# Altium schematic symbol library Electronic Devices_LIB.SchLib: 703 symbols (part 1 of 8) (continued)
## CAP_27pF_50V_NP0_0402
designator C?, comment Voltage Rating (DC): 50V  Capacitance: 27pF  Case/Package: 0402  (hidden comment: GRM1555C1H270JA01D)
Multilayer Ceramic Capacitor, 27 pF, 50 V, ± 5%, C0G (NP0), 0402 [1005 Metric]; Manufacturer: Murata; Temperature Coefficient: 30ppm/°C; Supplier 1: Mouser; Manufacturer Part Number: GRM1555C1H270JA01D; RoHS: Yes; Category: Ceramic Capacitors; Stock 1: 198325; Pricing 1: 1=0.1, 10=0.013, 50=0.013, 100=0.008, 1000=0.007, 10000=0.004 (USD); Mount: Surface Mount; Number of Pins: 2; Case Code (Metric): 1005; Case Code (Imperial): 0402; Material: Ceramic; Min Operating Temperature: -55°C; Max Operating Temperature: 125°C; Voltage Rating: 50V; Package Quantity: 1; Series: GRM; Tolerance: 5%; Packaging: Tape and Reel; Dielectric: C0G; Termination: SMD/SMT; Voltage: 50V; Construction: Flat; Length: 1mm; Width: 0.02inch; Height: 0.5mm; Thickness: 0.022inch; Depth: 0.5mm; Radiation Hardening: No; Reach SVHC Compliant: No; RoHS Compliant: Yes; Lead Free: Lead Free; ComponentLink1URL: https://datasheet.ciiva.com/6048/1784399-6048453.pdf?src-supplier=Farnell; ComponentLink1Description: https://datasheet.ciiva.com/6048/1784399-6048453.pdf?src-supplier=Farnell; ComponentLink2URL: https://datasheet.ciiva.com/2989/product-2989312.pdf?src-supplier=Avnet; ComponentLink2Description: https://datasheet.ciiva.com/2989/product-2989312.pdf?src-supplier=Avnet; ComponentLink3URL: https://datasheet.ciiva.com/18184/getdatasheetpartid-296877-18184278.pdf?src-supplier=Verical; ComponentLink3Description: https://datasheet.ciiva.com/18184/getdatasheetpartid-296877-18184278.pdf?src-supplier=Verical; ComponentLink4URL: https://datasheet.ciiva.com/6277/partnumbering-e-01-6277817.pdf?src-supplier=Digikey; ComponentLink4Description: https://datasheet.ciiva.com/6277/partnumbering-e-01-6277817.pdf?src-supplier=Digikey; ComponentLink5URL: https://datasheet.ciiva.com/6277/partnumbering-e-01-6277818.pdf?src-supplier=Digikey; ComponentLink5Description: https://datasheet.ciiva.com/6277/partnumbering-e-01-6277818.pdf?src-supplier=Digikey; ComponentLink6URL: https://datasheet.ciiva.com/6277/partnumbering-e-01-6277819.pdf?src-supplier=Digikey; ComponentLink6Description: https://datasheet.ciiva.com/6277/partnumbering-e-01-6277819.pdf?src-supplier=Digikey; ComponentLink7URL: https://datasheet.ciiva.com/7828/1784399-7828854.pdf?src-supplier=Element14; ComponentLink7Description: https://datasheet.ciiva.com/7828/1784399-7828854.pdf?src-supplier=Element14; ComponentLink8URL: https://datasheet.ciiva.com/16440/product-16440556.pdf?src-supplier=Future+Electronics; ComponentLink8Description: https://datasheet.ciiva.com/16440/product-16440556.pdf?src-supplier=Future+Electronics; Supplier Part Number 1: 81-GRM1555C1H270JA1D
footprint CAP_0402_CAPC1005X05N (Chip Capacitor, 2-Leads, Body 1.00x0.50mm, IPC Medium Density)
pins: 1, 2

## CAP_33uF_16V_X5R_1206
designator C?, comment Voltage Rating (DC): 16V  Capacitance: 33uF  Case/Package: 1206  (hidden comment: C3216X5R1C336M160AB)
C Series 1206 33 uF 16 V ±20 % Tolerance X5R SMT Multilayer Ceramic Capacitor; Manufacturer: TDK; Material: 4241ConductorMaterial; Tolerance: 20%; Supplier 1: Digikey; Manufacturer Part Number: C3216X5R1C336M160AB; RoHS: Yes; Category: Ceramic Capacitors; Stock 1: 76014; Pricing 1: 1=0.97, 10=0.7, 50=0.6118, 100=0.4985, 500=0.40788, 1000=0.35123 (USD); Mount: Surface Mount; Dielectric Material: Ceramic; Case Code (Metric): 3216; Case Code (Imperial): 1206; Weight: 0.000571oz; Min Operating Temperature: -55°C; Max Operating Temperature: 85°C; Packaging: Tape and Reel; Dielectric: X5R; Package Quantity: 2000; Voltage Rating: 16V; Termination: SMD/SMT; Series: C; Construction: Flat; Length: 3.2mm; Width: 1.6mm; Height: 1.6mm; Depth: 1.6mm; Radiation Hardening: No; Reach SVHC Compliant: No; Lead Free: Lead Free; RoHS Compliant: Yes; ComponentLink1URL: https://datasheet.ciiva.com/24219/c3216x5r1c336m160ab-265284-24219738.pdf?src-supplier=Mouser; ComponentLink1Description: https://datasheet.ciiva.com/24219/c3216x5r1c336m160ab-265284-24219738.pdf?src-supplier=Mouser; ComponentLink2URL: https://datasheet.ciiva.com/15192/getdatasheetpartid-714446-15192221.pdf?src-supplier=Verical; ComponentLink2Description: https://datasheet.ciiva.com/15192/getdatasheetpartid-714446-15192221.pdf?src-supplier=Verical; ComponentLink3URL: https://datasheet.ciiva.com/6285/tdkmlcccaprange-6285581.pdf?src-supplier=Digikey; ComponentLink3Description: https://datasheet.ciiva.com/6285/tdkmlcccaprange-6285581.pdf?src-supplier=Digikey; ComponentLink4URL: https://datasheet.ciiva.com/6285/tdkmlcccaprange-6285583.pdf?src-supplier=Digikey; ComponentLink4Description: https://datasheet.ciiva.com/6285/tdkmlcccaprange-6285583.pdf?src-supplier=Digikey; ComponentLink5URL: https://datasheet.ciiva.com/6285/tdkmlcccaprange-6285578.pdf?src-supplier=Digikey; ComponentLink5Description: https://datasheet.ciiva.com/6285/tdkmlcccaprange-6285578.pdf?src-supplier=Digikey; Supplier Part Number 1: 445-6002-1-ND
footprint CAP_1206_CAPC3216X16N (Chip Capacitor, 2-Leads, Body 3.20x1.60mm, IPC Medium Density)
pins: 1, 2

## CAP_33uF_16V_X5R_1812
designator C?, comment Voltage Rating (DC): 16V  Case Code (Imperial): 1812  Capacitance: 33uF  (hidden comment: C4532X5R1C336M250KA)
33 µF ±20% 16V Ceramic Capacitor X5R 1812 (4532 Metric); Manufacturer: TDK; Supplier 1: Digikey; Manufacturer Part Number: C4532X5R1C336M250KA; RoHS: Yes; Category: Ceramic Capacitors; Stock 1: 1235; Pricing 1: 1=1.06, 10=0.763, 50=0.6674, 100=0.5438 (USD); Mount: Surface Mount; Case/Package: 1812; Number of Pins: 2NUMBER; Case Code (Metric): 4532; Weight: 0.000952oz; Min Operating Temperature: -55°C; Max Operating Temperature: 85°C; Tolerance: 20%; Packaging: Cut Tape; Dielectric: X5R; Construction: Flat; Voltage Rating: 16V; Package Quantity: 500; Termination: SMD/SMT; Voltage: 16V; Series: C; Length: 4.5mm; Width: 3.2mm; Height: 2.5mm; Depth: 3.2mm; RoHS Compliant: Yes; Reach SVHC Compliant: No; ComponentLink1URL: https://datasheet.ciiva.com/24219/c4532x5r1c336m250ka-265571-24219720.pdf?src-supplier=Mouser; ComponentLink1Description: https://datasheet.ciiva.com/24219/c4532x5r1c336m250ka-265571-24219720.pdf?src-supplier=Mouser; ComponentLink2URL: https://datasheet.ciiva.com/11788/0900766b80c1bb00-11788291.pdf?src-supplier=Rs; ComponentLink2Description: https://datasheet.ciiva.com/11788/0900766b80c1bb00-11788291.pdf?src-supplier=Rs; ComponentLink3URL: https://datasheet.ciiva.com/16476/e412-c-16476108.pdf?src-supplier=Future+Electronics; ComponentLink3Description: https://datasheet.ciiva.com/16476/e412-c-16476108.pdf?src-supplier=Future+Electronics; ComponentLink4URL: https://datasheet.ciiva.com/6253/tdkmlcccaprange-6253381.pdf?src-supplier=Digikey; ComponentLink4Description: https://datasheet.ciiva.com/6253/tdkmlcccaprange-6253381.pdf?src-supplier=Digikey; ComponentLink5URL: https://datasheet.ciiva.com/6253/tdkmlcccaprange-6253383.pdf?src-supplier=Digikey; ComponentLink5Description: https://datasheet.ciiva.com/6253/tdkmlcccaprange-6253383.pdf?src-supplier=Digikey; Supplier Part Number 1: 445-1443-1-ND
footprint CAP_1218
pins: 1, 2

## CAP_47UF_10V_X5R_0805
designator C?, comment Voltage Rating (DC): 10V  Capacitance: 47uF  Case Code (Imperial): 0805  (hidden comment: C2012X5R1A476M125AC)
Multilayer Ceramic Capacitor, 47 uF, 10 V, ± 20%, X5R, 0805 [2012 Metric]; Manufacturer: TDK; Material: 4241ConductorMaterial; Supplier 1: Digikey; Manufacturer Part Number: C2012X5R1A476M125AC; RoHS: Yes; Category: Ceramic Capacitors; Stock 1: 476295; Pricing 1: 1=0.79, 10=0.572, 50=0.5006, 100=0.4079, 500=0.33372, 1000=0.28737 (USD); Mount: Surface Mount; Case/Package: 0805; Dielectric Material: Ceramic; Case Code (Metric): 2012; Weight: 0.000194oz; Min Operating Temperature: -55°C; Max Operating Temperature: 85°C; Tolerance: 20%; Packaging: Tape and Reel; Dielectric: X5R; Package Quantity: 1; Voltage Rating: 10V; Termination: SMD/SMT; Voltage: 10V; Series: C; Length: 2mm; Width: 0.049inch; Height: 1.25mm; Depth: 1.25mm; Thickness: 0.057inch; Lead Free: Lead Free; Reach SVHC Compliant: No; RoHS Compliant: Yes; ComponentLink1URL: https://datasheet.ciiva.com/24216/c2012x5r1a476m125ac-264921-24216523.pdf?src-supplier=Mouser; ComponentLink1Description: https://datasheet.ciiva.com/24216/c2012x5r1a476m125ac-264921-24216523.pdf?src-supplier=Mouser; ComponentLink2URL: https://datasheet.ciiva.com/24191/c2012x5r1a476m125ac-24191773.pdf?src-supplier=Future+Electronics; ComponentLink2Description: https://datasheet.ciiva.com/24191/c2012x5r1a476m125ac-24191773.pdf?src-supplier=Future+Electronics; ComponentLink3URL: https://datasheet.ciiva.com/7975/1796654-7975085.pdf?src-supplier=Element14; ComponentLink3Description: https://datasheet.ciiva.com/7975/1796654-7975085.pdf?src-supplier=Element14; ComponentLink4URL: https://datasheet.ciiva.com/22694/1796654-22694142.pdf?src-supplier=Element14; ComponentLink4Description: https://datasheet.ciiva.com/22694/1796654-22694142.pdf?src-supplier=Element14; ComponentLink5URL: https://datasheet.ciiva.com/6259/tdkmlcccaprange-6259576.pdf?src-supplier=Digikey; ComponentLink5Description: https://datasheet.ciiva.com/6259/tdkmlcccaprange-6259576.pdf?src-supplier=Digikey; ComponentLink6URL: https://datasheet.ciiva.com/6259/tdkmlcccaprange-6259575.pdf?src-supplier=Digikey; ComponentLink6Description: https://datasheet.ciiva.com/6259/tdkmlcccaprange-6259575.pdf?src-supplier=Digikey; ComponentLink7URL: https://datasheet.ciiva.com/6259/tdkmlcccaprange-6259577.pdf?src-supplier=Digikey; ComponentLink7Description: https://datasheet.ciiva.com/6259/tdkmlcccaprange-6259577.pdf?src-supplier=Digikey; Supplier Part Number 1: 445-8239-6-ND
footprint CAP_0805_CAPC2012X12N (Chip Capacitor, 2-Leads, Body 2.00x1.25mm, IPC Medium Density)
pins: 1, 2

## CAP_47UF_16V_X5R_1206
designator C?, comment Capacitance: 47uF  Voltage Rating: 16V  Case/Package: 1206  (hidden comment: EMK316BBJ476ML-T)
Multilayer Ceramic Capacitor, 47 uF, 16 V, ± 20%, X5R, 1206 [3216 Metric]; Manufacturer: Taiyo Yuden; Supplier 1: Digi-Key; Manufacturer Part Number: EMK316BBJ476ML-T; RoHS: Yes; Category: Ceramic Capacitors; Stock 1: 339005; Pricing 1: 1=0.64, 10=0.451, 50=0.38, 100=0.3095, 500=0.25792, 1000=0.21719 (USD); Mount: Surface Mount; Case Code (Imperial): 1206; Case Code (Metric): 3216; Min Operating Temperature: -55°C; Max Operating Temperature: 85°C; Packaging: Cut Tape; Tolerance: 20%; Series: M; RoHS Compliant: Yes; ComponentLink1URL: http://www.farnell.com/datasheets/2819853.pdf?src-supplier=Farnell; ComponentLink1Description: http://www.farnell.com/datasheets/2819853.pdf?src-supplier=Farnell; ComponentLink2URL: http://www.farnell.com/datasheets/2819853.pdf?src-supplier=Newark; ComponentLink2Description: http://www.farnell.com/datasheets/2819853.pdf?src-supplier=Newark; ComponentLink3URL: https://datasheet.octopart.com/EMK316BBJ476ML-T-Taiyo-Yuden-datasheet-103922570.pdf?src-supplier=Future+Electronics; ComponentLink3Description: https://datasheet.octopart.com/EMK316BBJ476ML-T-Taiyo-Yuden-datasheet-103922570.pdf?src-supplier=Future+Electronics; ComponentLink4URL: http://www.farnell.com/datasheets/2819853.pdf?src-supplier=Element14; ComponentLink4Description: http://www.farnell.com/datasheets/2819853.pdf?src-supplier=Element14; ComponentLink5URL: http://ds.yuden.co.jp/TYCOMPAS/ut/detail.do?productNo=EMK316BBJ476ML-T&fileName=EMK316BBJ476ML-T_SS&mode=specSheetDownload&src-supplier=Digi-Key; ComponentLink5Description: http://ds.yuden.co.jp/TYCOMPAS/ut/detail.do?productNo=EMK316BBJ476ML-T&fileName=EMK316BBJ476ML-T_SS&mode=specSheetDownload&src-supplier=Digi-Key; ComponentLink6URL: https://datasheet.octopart.com/EMK316BBJ476ML-T-Taiyo-Yuden-datasheet-140424376.pdf?src-supplier=Master+Electronics; ComponentLink6Description: https://datasheet.octopart.com/EMK316BBJ476ML-T-Taiyo-Yuden-datasheet-140424376.pdf?src-supplier=Master+Electronics; Supplier Part Number 1: 587-5425-1-ND
footprint CAP_1206_CAPC3216X16N (Chip Capacitor, 2-Leads, Body 3.20x1.60mm, IPC Medium Density)
pins: 1, 2

## CAP_47uF_35V_ELEC
designator C?, comment 865080543009  Capacitance: 47uF  Voltage Rating: 35V
Alum. Electrolytic Cap 47µF 35V 6.3mmV-Chip WCAP-ASLI; Lifetime 2000h +105°C | Wurth Electronics 865080543009; Ripple Current: 240mA; Impedance: 530mR; Tolerance: 20%; Supplier 1: Digi-Key; Manufacturer: Wurth Electronics; Manufacturer Part Number: 865080543009; RoHS: Yes; Category: Aluminum Electrolytic Capacitors; Stock 1: 88642; Pricing 1: 1=0.28, 50=0.237, 100=0.207, 250=0.183, 500=0.161 (USD); Mount: Surface Mount; Case/Package: Radial; Min Operating Temperature: -55°C; Max Operating Temperature: 105°C; Package Quantity: 1; Packaging: Cut Tape; Ripple Current (AC): 240mA; Voltage Rating (DC): 35V; Series: WCAP-ASLI; Diameter: 6.3mm; Height: 5.5mm; Height - Seated (Max): 0.217inch; RoHS Compliant: Yes; Reach SVHC Compliant: Unknown; ComponentLink1URL: http://www.farnell.com/datasheets/1880161.pdf?src-supplier=Farnell; ComponentLink1Description: http://www.farnell.com/datasheets/1880161.pdf?src-supplier=Farnell; ComponentLink2URL: http://www.farnell.com/datasheets/1880161.pdf?src-supplier=Element14; ComponentLink2Description: http://www.farnell.com/datasheets/1880161.pdf?src-supplier=Element14; ComponentLink3URL: http://www.farnell.com/datasheets/1880161.pdf?src-supplier=Newark; ComponentLink3Description: http://www.farnell.com/datasheets/1880161.pdf?src-supplier=Newark; ComponentLink4URL: https://katalog.we-online.de/pbs/datasheet/865080543009.pdf?src-supplier=Digi-Key; ComponentLink4Description: https://katalog.we-online.de/pbs/datasheet/865080543009.pdf?src-supplier=Digi-Key; Supplier Part Number 1: 732-8508-1-ND
footprint CAPAE660X550N (0.260" L x 0.260" W (6.60mm x 6.60mm))
pins: 1 +, 2 -

## CAP_100NF_4V_X5R_0201
designator C?, comment Voltage Rating: 4V  Capacitance: 100nF  Case/Package: 0201  (hidden comment: C0201C104K7PAC7867)
SMD Comm X5R 0201 (0603Metric) ceramic capacitor 0.024Lx0.012W 0.60mmx0.30mm X5R ±10% 0.1muF; Manufacturer: KEMET; Supplier 1: Digikey; Manufacturer Part Number: C0201C104K7PAC7867; RoHS: No; Category: Ceramic Capacitors; Stock 1: 29615; Pricing 1: 1=0.16, 10=0.111, 50=0.0662, 100=0.0521, 500=0.0385, 1000=0.03188, 2500=0.02967, 5000=0.02714 (USD); Mount: Surface Mount; Case Code (Imperial): 0201; Case Code (Metric): 0603; Min Operating Temperature: -55°C; Max Operating Temperature: 85°C; Packaging: Cut Tape; Tolerance: 10%; Series: C; ComponentLink1URL: https://api.kemet.com/component-edge/download/datasheet/C0201C104K7PAC7867.pdf?src-supplier=Digikey; ComponentLink1Description: https://api.kemet.com/component-edge/download/datasheet/C0201C104K7PAC7867.pdf?src-supplier=Digikey; Supplier Part Number 1: 399-14860-6-ND
footprint CAP_0201_CAPC0603X03N (Chip Capacitor, 2-Leads, Body 0.60x0.30mm, IPC Medium Density)
pins: 1, 2

## CAP_100nF_10V_X5R_0402
designator C?, comment Case Code (Imperial): 0402  Voltage Rating (DC): 10V  Capacitance: 100nF  (hidden comment: GRM155R61A104KA01D)
Multilayer Ceramic Capacitor, 0.1 uF, 10 V, ± 10%, X5R, 0402 [1005 Metric]; Manufacturer: Murata; Supplier 1: Digikey; Manufacturer Part Number: GRM155R61A104KA01D; RoHS: Yes; Category: Ceramic Capacitors; Stock 1: 2175825; Pricing 1: 1=0.1, 10=0.033, 50=0.0192, 100=0.0148, 500=0.01118, 1000=0.00878, 2500=0.00798, 5000=0.00734 (USD); Mount: Surface Mount; Case/Package: 0402; Number of Pins: 2; Case Code (Metric): 1005; Min Operating Temperature: -55°C; Max Operating Temperature: 85°C; Tolerance: 10%; Packaging: Tape and Reel; Voltage Rating: 10V; Package Quantity: 1; Dielectric: X5R; Termination: SMD/SMT; Voltage: 10V; Series: GRM; Length: 1mm; Width: 0.02inch; Height: 0.5mm; Thickness: 0.022inch; Depth: 0.5mm; Radiation Hardening: No; Reach SVHC Compliant: No; Lead Free: Lead Free; RoHS Compliant: Yes; ComponentLink1URL: https://datasheet.ciiva.com/162/product-162752.pdf?src-supplier=Digikey; ComponentLink1Description: https://datasheet.ciiva.com/162/product-162752.pdf?src-supplier=Digikey; ComponentLink2URL: https://datasheet.ciiva.com/18102/getdatasheetpartid-74533-18102605.pdf?src-supplier=Verical; ComponentLink2Description: https://datasheet.ciiva.com/18102/getdatasheetpartid-74533-18102605.pdf?src-supplier=Verical; ComponentLink3URL: https://datasheet.ciiva.com/162/partnumbering-e-01-162751.pdf?src-supplier=Digikey; ComponentLink3Description: https://datasheet.ciiva.com/162/partnumbering-e-01-162751.pdf?src-supplier=Digikey; ComponentLink4URL: https://datasheet.ciiva.com/162/partnumbering-e-01-162753.pdf?src-supplier=Digikey; ComponentLink4Description: https://datasheet.ciiva.com/162/partnumbering-e-01-162753.pdf?src-supplier=Digikey; ComponentLink5URL: https://datasheet.ciiva.com/22698/608985-22698411.pdf?src-supplier=Element14; ComponentLink5Description: https://datasheet.ciiva.com/22698/608985-22698411.pdf?src-supplier=Element14; ComponentLink6URL: https://datasheet.ciiva.com/28584/608985-28584203.pdf?src-supplier=Element14; ComponentLink6Description: https://datasheet.ciiva.com/28584/608985-28584203.pdf?src-supplier=Element14; ComponentLink7URL: https://datasheet.ciiva.com/28685/608985-28685384.pdf?src-supplier=Element14; ComponentLink7Description: https://datasheet.ciiva.com/28685/608985-28685384.pdf?src-supplier=Element14; ComponentLink8URL: https://datasheet.ciiva.com/16199/product-16199050.pdf?src-supplier=Future+Electronics; ComponentLink8Description: https://datasheet.ciiva.com/16199/product-16199050.pdf?src-supplier=Future+Electronics; ComponentLink9URL: https://datasheet.ciiva.com/7718/608985-7718999.pdf?src-supplier=Element14; ComponentLink9Description: https://datasheet.ciiva.com/7718/608985-7718999.pdf?src-supplier=Element14; Supplier Part Number 1: 490-1318-1-ND
footprint CAP_0402_CAPC1005X05N (Chip Capacitor, 2-Leads, Body 1.00x0.50mm, IPC Medium Density)
pins: 1, 2

## CAP_100NF_16V_X7R_0402
designator C?, comment Voltage Rating: 16V  Capacitance: 100nF  Case/Package: 0402  (hidden comment: CL05B104KO5NNNC)
Multilayer Ceramic Capacitor, 0.1 uF, 16 V, ± 10%, X7R, 0402 [1005 Metric]; Manufacturer: Samsung; Supplier 1: Digi-Key; Manufacturer Part Number: CL05B104KO5NNNC; RoHS: Yes; Category: Ceramic Capacitors; Stock 1: 11081064; Pricing 1: 1=0.1, 10=0.024, 50=0.013, 100=0.0105, 500=0.00752, 1000=0.00592, 2500=0.00538, 5000=0.00495 (USD); Mount: Surface Mount; Case Code (Metric): 1005; Case Code (Imperial): 0402; Material: Ceramic; Min Operating Temperature: -55°C; Max Operating Temperature: 125°C; Tolerance: 10%; Package Quantity: 1; Packaging: Tape and Reel; Dielectric: X7R; Series: CL; Voltage: 16V; Voltage Rating (DC): 16V; Construction: Flat; Length: 1mm; Width: 0.02inch; Height: 0.5mm; Thickness: 0.022inch; Depth: 0.5mm; Radiation Hardening: No; RoHS Compliant: Yes; Lead Free: Lead Free; ComponentLink1URL: https://datasheet.ciiva.com/26920/getdatasheetpartid-359683-26920169.pdf?src-supplier=Verical; ComponentLink1Description: https://datasheet.ciiva.com/26920/getdatasheetpartid-359683-26920169.pdf?src-supplier=Verical; ComponentLink2URL: https://datasheet.ciiva.com/29198/458718-da-01-en-vs-kondensator-0402-29198423.pdf?src-supplier=Conrad; ComponentLink2Description: https://datasheet.ciiva.com/29198/458718-da-01-en-vs-kondensator-0402-29198423.pdf?src-supplier=Conrad; ComponentLink3URL: https://datasheet.ciiva.com/16208/cl05b104kq5nnnc-16208343.pdf?src-supplier=Future+Electronics; ComponentLink3Description: https://datasheet.ciiva.com/16208/cl05b104kq5nnnc-16208343.pdf?src-supplier=Future+Electronics; ComponentLink4URL: https://datasheet.ciiva.com/26309/mlcc-catalogdownload2013-eng-26309003.pdf?src-supplier=Distrelec; ComponentLink4Description: https://datasheet.ciiva.com/26309/mlcc-catalogdownload2013-eng-26309003.pdf?src-supplier=Distrelec; Supplier Part Number 1: 1276-1001-6-ND
footprint CAP_0402_CAPC1005X05N (Chip Capacitor, 2-Leads, Body 1.00x0.50mm, IPC Medium Density)
pins: 1, 2

## CAP_100NF_16V_X7R_0603
designator C?, comment Voltage: 16V  Capacitance: 100nF  Case/Package: 0603  (hidden comment: CL10B104KO8NNNC)
Ceramic capacitor SMD-0603 100nF /16V X7R# K +-10%, Samsung, RoHS; Dielectric: X7R; Tolerance: 10%; Manufacturer: Samsung; Manufacturer Part Number: CL10B104KO8NNNC; RoHS: Yes; Category: Ceramic Capacitors; Stock 1: 9799745; Pricing 1: 1=0.10000, 10=0.02700, 50=0.01500, 100=0.01220, 500=0.00874, 1000=0.00686 (USD); Mount: Surface Mount; Case Code (Metric): 1608; Case Code (Imperial): 0603; Material: Ceramic; Contact Plating: Tin; Min Operating Temperature: -55°C; Max Operating Temperature: 125°C; Packaging: Tape and Reel; Package Quantity: 1; Voltage Rating: 16V; Series: CL; Length: 1.6mm; Width: 0.031inch; Height: 0.8mm; Depth: 0.8mm; Thickness: 0.035inch; Radiation Hardening: No; Lead Free: Lead Free; RoHS Compliant: Yes; ComponentLink1URL: https://datasheet.ciiva.com/25805/cl10b104ko8nnnc-25805483.pdf?src-supplier=Digi-Key; ComponentLink1Description: https://datasheet.ciiva.com/25805/cl10b104ko8nnnc-25805483.pdf?src-supplier=Digi-Key; ComponentLink2URL: https://datasheet.ciiva.com/26838/getdatasheetpartid-357417-26838418.pdf?src-supplier=Verical; ComponentLink2Description: https://datasheet.ciiva.com/26838/getdatasheetpartid-357417-26838418.pdf?src-supplier=Verical; ComponentLink3URL: https://datasheet.ciiva.com/29198/456679-da-01-en-vs-kondensator-0603-29198846.pdf?src-supplier=Conrad; ComponentLink3Description: https://datasheet.ciiva.com/29198/456679-da-01-en-vs-kondensator-0603-29198846.pdf?src-supplier=Conrad; Supplier 1: Digi-Key; Supplier 2: Newark; Supplier 3: Mouser; Supplier Part Number 1: 1276-1005-1-ND; Supplier Part Number 2: 82AC9325; Supplier Part Number 3: 187-CL10B104KO8NNNC
footprint CAP_0603_CAPC1608X08N (Chip Capacitor, 2-Leads, Body 1.60x0.80mm, IPC Medium Density)
pins: 1, 2

## CAP_100nF_16V_X7S_0201
designator C?, comment Voltage Rating: 16V  Capacitance: 100nF  Case/Package: 0201  (hidden comment: GRM033C71C104KE14D)
Multilayer Ceramic Capacitor, 0.1 uF, 16 V, ± 10%, X7S, 0201 [0603 Metric]; Manufacturer: Murata; Material: 4241ConductorMaterial; Supplier 1: Digikey; Manufacturer Part Number: GRM033C71C104KE14D; RoHS: Yes; Category: Ceramic Capacitors; Stock 1: 1786846; Pricing 1: 1=0.1, 10=0.032, 50=0.0186, 100=0.0144, 500=0.01082, 1000=0.0085, 2500=0.00772, 5000=0.00711 (USD); Mount: Surface Mount; Case Code (Metric): 0603; Case Code (Imperial): 0201; Weight: 1.2E-05oz; Min Operating Temperature: -55°C; Max Operating Temperature: 125°C; Packaging: Tape and Reel; Tolerance: 10%; Dielectric: X7S; Termination: SMD/SMT; Voltage Rating (DC): 16V; Package Quantity: 15000; Series: GRM; Length: 0.024inch; Width: 0.012inch; Height: 0.3mm; Thickness: 0.013inch; RoHS Compliant: Yes; ComponentLink1URL: http://www.farnell.com/datasheets/2867828.pdf?src-supplier=Farnell; ComponentLink1Description: http://www.farnell.com/datasheets/2867828.pdf?src-supplier=Farnell; ComponentLink2URL: http://www.mouser.com/ds/2/281/c02e-2905.pdf?src-supplier=Mouser; ComponentLink2Description: http://www.mouser.com/ds/2/281/c02e-2905.pdf?src-supplier=Mouser; ComponentLink3URL: https://search.murata.co.jp/Ceramy/image/img/A01X/G101/ENG/GRM033C71C104KE14-01.pdf?src-supplier=Digikey; ComponentLink3Description: https://search.murata.co.jp/Ceramy/image/img/A01X/G101/ENG/GRM033C71C104KE14-01.pdf?src-supplier=Digikey; ComponentLink4URL: http://www.farnell.com/datasheets/2867828.pdf?src-supplier=Element14; ComponentLink4Description: http://www.farnell.com/datasheets/2867828.pdf?src-supplier=Element14; ComponentLink5URL: https://datasheet.octopart.com/GRM033C71C104KE14D-Murata-datasheet-22122223.pdf?src-supplier=Future+Electronics; ComponentLink5Description: https://datasheet.octopart.com/GRM033C71C104KE14D-Murata-datasheet-22122223.pdf?src-supplier=Future+Electronics; ComponentLink6URL: http://www.farnell.com/datasheets/2867828.pdf?src-supplier=Newark; ComponentLink6Description: http://www.farnell.com/datasheets/2867828.pdf?src-supplier=Newark; Supplier Part Number 1: 490-10387-6-ND
footprint CAP_0201_CAPC0603X03N (Chip Capacitor, 2-Leads, Body 0.60x0.30mm, IPC Medium Density)
pins: 1, 2

## CAP_100NF_25V_X7R_0402
designator C?, comment Capacitance: 100nF  Voltage Rating: 25V  Case/Package: 0402  (hidden comment: CC0402KRX5R8BB104)
Multilayer Ceramic Capacitor, 0.1 uF, 25 V, ± 10%, X7R, 0402 [1005 Metric]; Manufacturer: Yageo; Material: 4241ConductorMaterial; Dielectric: X5R; Temperature Coefficient: 30ppm/°C; Supplier 1: Digikey; Manufacturer Part Number: CC0402KRX5R8BB104; RoHS: Yes; Category: Ceramic Capacitors; Stock 1: 3706055; Pricing 1: 1=0.1, 10=0.037, 50=0.021, 100=0.0162, 500=0.01224, 1000=0.00961, 2500=0.00874, 5000=0.00804 (USD); Mount: Surface Mount; Case Code (Metric): 1005; Case Code (Imperial): 0402; Min Operating Temperature: -55°C; Max Operating Temperature: 85°C; Tolerance: 10%; Packaging: Tape and Reel; Voltage Rating (DC): 25V; Series: CC; RoHS Compliant: Yes; Lead Free: 5697LeadFree; Halogen Free: 5694HalogenFree; ComponentLink1URL: http://www.mouser.com/ds/2/447/UPY-GPHC_X5R_4V-to-50V_25-1131599.pdf?src-supplier=Mouser; ComponentLink1Description: http://www.mouser.com/ds/2/447/UPY-GPHC_X5R_4V-to-50V_25-1131599.pdf?src-supplier=Mouser; ComponentLink2URL: https://datasheet.octopart.com/CC0402KRX5R8BB104-Yageo-datasheet-137700082.pdf?src-supplier=Future+Electronics; ComponentLink2Description: https://datasheet.octopart.com/CC0402KRX5R8BB104-Yageo-datasheet-137700082.pdf?src-supplier=Future+Electronics; ComponentLink3URL: http://www.yageo.com/documents/recent/UPY-GPHC_X5R_4V-to-50V_25.pdf?src-supplier=Digikey; ComponentLink3Description: http://www.yageo.com/documents/recent/UPY-GPHC_X5R_4V-to-50V_25.pdf?src-supplier=Digikey; ComponentLink4URL: https://datasheet.octopart.com/CC0402KRX5R8BB104-Yageo-datasheet-140260304.pdf?src-supplier=Newark; ComponentLink4Description: https://datasheet.octopart.com/CC0402KRX5R8BB104-Yageo-datasheet-140260304.pdf?src-supplier=Newark; ComponentLink5URL: https://datasheet.octopart.com/CC0402KRX5R8BB104-Yageo-datasheet-170350636.pdf?src-supplier=Future+Electronics; ComponentLink5Description: https://datasheet.octopart.com/CC0402KRX5R8BB104-Yageo-datasheet-170350636.pdf?src-supplier=Future+Electronics; ComponentLink6URL: http://www.yageo.com/documents/recent/UPY-GPHC_X5R_4V-to-50V-16.pdf?src-supplier=Future+Electronics; ComponentLink6Description: http://www.yageo.com/documents/recent/UPY-GPHC_X5R_4V-to-50V-16.pdf?src-supplier=Future+Electronics; Supplier Part Number 1: 311-1697-6-ND
footprint CAP_0402_CAPC1005X05N (Chip Capacitor, 2-Leads, Body 1.00x0.50mm, IPC Medium Density)
pins: 1, 2

## CAP_100nF_25V_X7R_0603
designator C?, comment Voltage Rating: 25V  Capacitance: 100nF  Case/Package: 0603  (hidden comment: TMK107BJ104KA-T)
0603 0.1 uF 25 V ±10 % Tolerance X7R Surface Mount Multilayer Ceramic Capacitor; Manufacturer: Taiyo Yuden; Tolerance: 10%; Dielectric: X5R; Supplier 1: Digi-Key; Manufacturer Part Number: TMK107BJ104KA-T; RoHS: Yes; Category: Ceramic Capacitors; Stock 1: 1007578; Pricing 1: 1=0.1, 10=0.033, 50=0.0182, 100=0.0148, 500=0.0106, 1000=0.00833 (USD); Mount: Surface Mount; Number of Pins: 2; Case Code (Imperial): 0603; Case Code (Metric): 1608; Min Operating Temperature: -55°C; Max Operating Temperature: 85°C; Packaging: Tape and Reel; Voltage Rating (DC): 25V; Termination: SMD/SMT; Series: M; Construction: Flat; Length: 1.6mm; Width: 0.031inch; Height: 0.8mm; Thickness: 0.035inch; Depth: 0.8mm; Radiation Hardening: No; Lead Free: Lead Free; RoHS Compliant: Yes; Reach SVHC Compliant: Unknown; ComponentLink1URL: https://datasheet.ciiva.com/7975/mlcc-all-e-7975852.pdf?src-supplier=Element14; ComponentLink1Description: https://datasheet.ciiva.com/7975/mlcc-all-e-7975852.pdf?src-supplier=Element14; ComponentLink2URL: https://datasheet.ciiva.com/11601/mlcc-all-e-11601852.pdf?src-supplier=Avnet; ComponentLink2Description: https://datasheet.ciiva.com/11601/mlcc-all-e-11601852.pdf?src-supplier=Avnet; ComponentLink3URL: https://datasheet.ciiva.com/34373/emultilayer-ceramic-capacitor-34373324.pdf?src-supplier=Onlinecomponents.com; ComponentLink3Description: https://datasheet.ciiva.com/34373/emultilayer-ceramic-capacitor-34373324.pdf?src-supplier=Onlinecomponents.com; Package Quantity: 1; Supplier Part Number 1: 587-1245-1-ND
footprint CAP_0603_CAPC1608X08N (Chip Capacitor, 2-Leads, Body 1.60x0.80mm, IPC Medium Density)
pins: 1, 2

## CAP_100NF_50V_X7R_0402
designator C?, comment Voltage Rating: 50V  Capacitance: 100nF  Case/Package: 0402  (hidden comment: GRM155R71H104KE14D)
Multilayer Ceramic Capacitor, 0.1 uF, 16 V, ± 10%, X7R, 0402 [1005 Metric]; Manufacturer: Murata; Dissipation Factor: 0.025%; Temperature Coefficient: 30ppm/°C; Supplier 1: DigiKey; Manufacturer Part Number: GRM155R71H104KE14D; RoHS: Yes; Category: Ceramic Capacitors; Stock 1: 13730790; Pricing 1: 1=0.1, 10=0.023, 50=0.0132, 100=0.0102, 500=0.00768, 1000=0.00603, 2500=0.00548, 5000=0.00504 (USD); Mount: Surface Mount; Number of Pins: 2NUMBER; Case Code (Metric): 1005; Material: Ceramic; Case Code (Imperial): 0402; Weight: 0.000212oz; Dielectric Material: Ceramic; Min Operating Temperature: -55°C; Max Operating Temperature: 125°C; Packaging: Tape and Reel; Package Quantity: 10000; Series: GRM; Tolerance: 10%; Dielectric: X7R; Termination: SMD/SMT; Voltage: 50V; Voltage Rating (DC): 50V; Construction: Flat; Length: 1mm; Width: 0.5mm; Height: 0.5mm; Depth: 0.5mm; Thickness: 0.022inch; Reach SVHC Compliant: No; RoHS Compliant: Yes; Lead Free: 5697LeadFree; ComponentLink1URL: http://www.farnell.com/datasheets/2079156.pdf?src-supplier=Farnell; ComponentLink1Description: http://www.farnell.com/datasheets/2079156.pdf?src-supplier=Farnell; ComponentLink2URL: http://www.mouser.com/ds/2/281/c02e-2905.pdf?src-supplier=Mouser; ComponentLink2Description: http://www.mouser.com/ds/2/281/c02e-2905.pdf?src-supplier=Mouser; ComponentLink3URL: http://www.farnell.com/datasheets/2079156.pdf?src-supplier=Newark; ComponentLink3Description: http://www.farnell.com/datasheets/2079156.pdf?src-supplier=Newark; ComponentLink4URL: https://datasheet.octopart.com/GRM155R71H104KE14D-Murata-datasheet-22122223.pdf?src-supplier=Future+Electronics; ComponentLink4Description: https://datasheet.octopart.com/GRM155R71H104KE14D-Murata-datasheet-22122223.pdf?src-supplier=Future+Electronics; ComponentLink5URL: https://search.murata.co.jp/Ceramy/image/img/A01X/G101/ENG/GRM155R71H104KE14-01.pdf?src-supplier=Digi-Key; ComponentLink5Description: https://search.murata.co.jp/Ceramy/image/img/A01X/G101/ENG/GRM155R71H104KE14-01.pdf?src-supplier=Digi-Key; ComponentLink6URL: http://psearch.en.murata.com/capacitor/product/GRM155R71H104KE14%23.pdf?src-supplier=Avnet; ComponentLink6Description: http://psearch.en.murata.com/capacitor/product/GRM155R71H104KE14%23.pdf?src-supplier=Avnet; ComponentLink7URL: https://datasheet.octopart.com/GRM155R71H104KE14D-Murata-datasheet-66077078.pdf?src-supplier=Element14; ComponentLink7Description: https://datasheet.octopart.com/GRM155R71H104KE14D-Murata-datasheet-66077078.pdf?src-supplier=Element14; Supplier Part Number 1: 490-10700-6-ND; Supplier 2: Digikey; Stock 2: 3706055; Pricing 2: 1=0.1, 10=0.037, 50=0.021, 100=0.0162, 500=0.01224, 1000=0.00961, 2500=0.00874, 5000=0.00804 (USD); Halogen Free: 5694HalogenFree; ComponentLink8URL: http://www.mouser.com/ds/2/447/UPY-GPHC_X5R_4V-to-50V_25-1131599.pdf?src-supplier=Mouser; ComponentLink8Description: http://www.mouser.com/ds/2/447/UPY-GPHC_X5R_4V-to-50V_25-1131599.pdf?src-supplier=Mouser; ComponentLink9URL: https://datasheet.octopart.com/CC0402KRX5R8BB104-Yageo-datasheet-137700082.pdf?src-supplier=Future+Electronics; ComponentLink9Description: https://datasheet.octopart.com/CC0402KRX5R8BB104-Yageo-datasheet-137700082.pdf?src-supplier=Future+Electronics; ComponentLink10URL: http://www.yageo.com/documents/recent/UPY-GPHC_X5R_4V-to-50V_25.pdf?src-supplier=Digikey; ComponentLink10Description: http://www.yageo.com/documents/recent/UPY-GPHC_X5R_4V-to-50V_25.pdf?src-supplier=Digikey; ComponentLink11URL: https://datasheet.octopart.com/CC0402KRX5R8BB104-Yageo-datasheet-140260304.pdf?src-supplier=Newark; ComponentLink11Description: https://datasheet.octopart.com/CC0402KRX5R8BB104-Yageo-datasheet-140260304.pdf?src-supplier=Newark; ComponentLink12URL: https://datasheet.octopart.com/CC0402KRX5R8BB104-Yageo-datasheet-170350636.pdf?src-supplier=Future+Electronics; ComponentLink12Description: https://datasheet.octopart.com/CC0402KRX5R8BB104-Yageo-datasheet-170350636.pdf?src-supplier=Future+Electronics; ComponentLink13URL: http://www.yageo.com/documents/recent/UPY-GPHC_X5R_4V-to-50V-16.pdf?src-supplier=Future+Electronics; ComponentLink13Description: http://www.yageo.com/documents/recent/UPY-GPHC_X5R_4V-to-50V-16.pdf?src-supplier=Future+Electronics; Supplier Part Number 2: 311-1697-1-ND
footprint CAP_0402_CAPC1005X05N (Chip Capacitor, 2-Leads, Body 1.00x0.50mm, IPC Medium Density)
pins: 1, 2

## CAP_100PF_16V_NP0_0402
designator C?, comment Voltage Rating (DC): 16V  Capacitance: 100pF  Case/Package: 0402  (hidden comment: CC0402JRNPO7BN101)
0402 100 pF 16 V ±5 % Tolerance NP0 SMT Multilayer Ceramic Capacitor; Manufacturer: Yageo; Tolerance: 5%; Supplier 1: Digi-Key; Manufacturer Part Number: CC0402JRNPO7BN101; RoHS: Yes; Category: Ceramic Capacitors; Stock 1: 66004; Pricing 1: 1=0.1, 10=0.024, 50=0.013, 100=0.0107, 500=0.00764, 1000=0.006, 2500=0.00546, 5000=0.00502 (USD); Mount: Surface Mount; Number of Pins: 2; Case Code (Imperial): 0402; Case Code (Metric): 1005; Weight: 2.3E-05oz; Min Operating Temperature: -55°C; Max Operating Temperature: 125°C; Packaging: Tape and Reel; Voltage Rating: 16V; Dielectric: NP0; Termination: SMD/SMT; Series: CC; Length: 0.039inch; Width: 0.02inch; Thickness: 0.022inch; Lead Free: Lead Free; RoHS Compliant: Yes; ComponentLink1URL: http://www.mouser.com/ds/2/447/Yageo_UPY-GP_NP0_16V-to-50V_9-358835.pdf?src-supplier=Mouser; ComponentLink1Description: http://www.mouser.com/ds/2/447/Yageo_UPY-GP_NP0_16V-to-50V_9-358835.pdf?src-supplier=Mouser; ComponentLink2URL: https://datasheet.octopart.com/CC0402JRNPO7BN101-Yageo-datasheet-137700082.pdf?src-supplier=Future+Electronics; ComponentLink2Description: https://datasheet.octopart.com/CC0402JRNPO7BN101-Yageo-datasheet-137700082.pdf?src-supplier=Future+Electronics; ComponentLink3URL: http://www.yageo.com/documents/recent/UPY-GP_NP0_16V-to-50V_9.pdf?src-supplier=Future+Electronics; ComponentLink3Description: http://www.yageo.com/documents/recent/UPY-GP_NP0_16V-to-50V_9.pdf?src-supplier=Future+Electronics; ComponentLink4URL: http://www.yageo.com/exep/pages/download/literatures/ProductSelectionGuide%202014_Final_2.pdf?src-supplier=Digi-Key; ComponentLink4Description: http://www.yageo.com/exep/pages/download/literatures/ProductSelectionGuide%202014_Final_2.pdf?src-supplier=Digi-Key; ComponentLink5URL: https://www.yageo.com/upload/media/product/productsearch/datasheet/mlcc/UPY-GP_NP0_16V-to-50V_18.pdf?src-supplier=Digi-Key; ComponentLink5Description: https://www.yageo.com/upload/media/product/productsearch/datasheet/mlcc/UPY-GP_NP0_16V-to-50V_18.pdf?src-supplier=Digi-Key; ComponentLink6URL: http://www.yageo.com/documents/recent/UPY-GP_NP0_16V-to-50V_16.pdf?src-supplier=Digi-Key; ComponentLink6Description: http://www.yageo.com/documents/recent/UPY-GP_NP0_16V-to-50V_16.pdf?src-supplier=Digi-Key; ComponentLink7URL: https://datasheet.octopart.com/CC0402JRNPO7BN101-Yageo-datasheet-65873193.pdf?src-supplier=Farnell; ComponentLink7Description: https://datasheet.octopart.com/CC0402JRNPO7BN101-Yageo-datasheet-65873193.pdf?src-supplier=Farnell; Supplier Part Number 1: 311-3743-1-ND
footprint CAP_0402_CAPC1005X05N (Chip Capacitor, 2-Leads, Body 1.00x0.50mm, IPC Medium Density)
pins: 1, 2

## CAP_100UF_16V_X5R_1210
designator C?, comment Voltage Rating: 16V  Capacitance: 100uF  Case/Package: 1210  (hidden comment: EMK325ABJ107MM-T)
Multilayer Ceramic Capacitor, 100 uF, 16 V, ± 20%, X5R, 1210 [3225 Metric]; Manufacturer: Taiyo Yuden; Material: 4241ConductorMaterial; Supplier 1: Digikey; Manufacturer Part Number: EMK325ABJ107MM-T; RoHS: Yes; Category: Ceramic Capacitors; Stock 1: 503358; Pricing 1: 1=1.73, 10=1.295, 50=1.1816, 100=0.9681 (USD); Mount: Surface Mount; Case Code (Metric): 3225; Case Code (Imperial): 1210; Min Operating Temperature: -55°C; Max Operating Temperature: 85°C; Tolerance: 20%; Packaging: Tape and Reel; Package Quantity: 500; Voltage Rating (DC): 16V; Dielectric: X5R; Termination: SMD/SMT; Series: M; Length: 3.2mm; Width: 2.5mm; Height: 2.5mm; Reach SVHC Compliant: No; RoHS Compliant: Yes; ComponentLink1URL: http://www.farnell.com/datasheets/1497285.pdf?src-supplier=Farnell; ComponentLink1Description: http://www.farnell.com/datasheets/1497285.pdf?src-supplier=Farnell; Supplier Part Number 1: 587-3152-1-ND
footprint CAP_1210_CAPC3225X270N (0.126" L x 0.098" W (3.20mm x 2.50mm))
pins: 1, 2

## CAP_100uF_35V_POL
designator C?, comment Capacitance: 100uF  (hidden comment: EMZA350ARA101MF80G)
MZA Series 35 V 100 uF 6.6 x 7.7 mm SMT Aluminum Electrolytic Capacitor; Manufacturer: United Chemi-Con; Dielectric Material: Aluminium; Polarity: Polar; Dissipation Factor: 12%; Lead/Base Style: Straight; Life (Hours): 2000Hour; Ripple Current: 280mA; Test Frequency: 100MHz; Tolerance: 20%; Voltage: 35V; Supplier 1: Digikey; Manufacturer Part Number: EMZA350ARA101MF80G; RoHS: No; Category: LDO; Stock 1: 64251; Pricing 1: 1=0.62, 10=0.417, 50=0.3318, 100=0.2741, 900=0.19271, 1800=0.182, 2700=0.1713, 4500=0.16059, 9000=0.14988, 22500=0.14721, 45000=0.14453 (USD); Mount: Surface Mount; Case/Package: SMD/SMT; Number of Pins: 2; Contact Plating: Tin; Packaging: Tape and Reel; Termination: SMD/SMT; Diameter: 6.3mm; Length: 7.7mm; Height: 7.7mm; Radiation Hardening: No; Lead Free: Lead Free; Reach SVHC Compliant: No; Supplier Part Number 1: 565-EMZA350ARA101MF80GCT-ND
footprint CAP_POL_CHEMI-F80
pins: 1, 2

## CAP_100UF_50V_POL
designator C?, comment UUD1H101MNL1GS  (value not drawn)
Radial Can - SMD ALUMINUM ELECTROLYTIC CAPACITOR UUD 50V 100muF ±20% 0.315Dia 8.00mm; Manufacturer: Nichicon; Dielectric Material: Aluminium; Ripple Current (AC): 300mA; Impedance: 340mR; Capacitance: 100uF; Leakage Current: 3uA; Life (Hours): 5000Hour; Dissipation Factor: 0.14%; Polarity: 5066Direction; Lead Diameter: 1.1mm; Supplier 1: Mouser; Manufacturer Part Number: UUD1H101MNL1GS; RoHS: Yes; Category: Aluminum Electrolytic Capacitors; Stock 1: 2204; Pricing 1: 1=0.53, 10=0.313, 50=0.313, 100=0.202, 500=0.202, 1000=0.171, 2500=0.151, 10000=0.138, 25000=0.136, 50000=0.131 (USD); Case/Package: Radial; Number of Pins: 2; Min Operating Temperature: -55°C; Max Operating Temperature: 105°C; Tolerance: 20%; Voltage Rating (DC): 50V; Package Quantity: 500; Ripple Current: 300mA; Packaging: Tape and Reel; Voltage Rating: 50V; Termination: SMD/SMT; Voltage: 50V; Series: UD; Construction: Cylindrical; Voltage Rating (AC): 50V; Diameter: 8mm; Length: 10mm; Height: 10mm; Lead Pitch: 3.1mm; Height - Seated (Max): 0.394inch; Radiation Hardening: No; Reach SVHC Compliant: No; Lead Free: Lead Free; RoHS Compliant: Yes; ComponentLink1URL: https://datasheet.ciiva.com/11781/0900766b80fa39e7-11781901.pdf?src-supplier=Rs; ComponentLink1Description: https://datasheet.ciiva.com/11781/0900766b80fa39e7-11781901.pdf?src-supplier=Rs; ComponentLink2URL: https://datasheet.ciiva.com/28458/e-ud-28458117.pdf?src-supplier=Element14; ComponentLink2Description: https://datasheet.ciiva.com/28458/e-ud-28458117.pdf?src-supplier=Element14; ComponentLink3URL: https://datasheet.ciiva.com/28458/1910936-28458133.pdf?src-supplier=Element14; ComponentLink3Description: https://datasheet.ciiva.com/28458/1910936-28458133.pdf?src-supplier=Element14; ComponentLink4URL: https://datasheet.ciiva.com/7781/66055-7781450.pdf?src-supplier=Element14; ComponentLink4Description: https://datasheet.ciiva.com/7781/66055-7781450.pdf?src-supplier=Element14; ComponentLink5URL: https://datasheet.ciiva.com/5362/e-ud-5362134.pdf?src-supplier=Mouser; ComponentLink5Description: https://datasheet.ciiva.com/5362/e-ud-5362134.pdf?src-supplier=Mouser; Supplier Part Number 1: 647-UUD1H101MNL
footprint CAP_POLA_UD(8X10) (UD(8X10))
pins: 1, 2

## CAP_150uF_10V_TANT
designator C?, comment T495D157K010ATE100  (value not drawn)
Cap Tant Solid 150uF 10V D CASE 10% (7.3 X 4.3 X 2.8mm) SMD 7343-31 0.1 Ohm 125 C T/R; Manufacturer: KEMET; ESR (Equivalent Series Resistance): 100mR; Leakage Current: 15uA; Dissipation Factor: 8%; Polarity: Polar; Ripple Current: 490mA; Supplier 1: Digikey; Manufacturer Part Number: T495D157K010ATE100; RoHS: Yes; Category: Tantalum Capacitors; Stock 1: 27553; Pricing 1: 1=1.86, 10=1.394, 50=1.272, 100=1.0421, 500=0.83172, 1000=0.73387, 2500=0.68494, 5000=0.66048, 12500=0.62379 (USD); Mount: Surface Mount; Case/Package: 2917; Number of Pins: 2; Case Code (Metric): 7343; Case Code (Imperial): 2917; Min Operating Temperature: -55°C; Max Operating Temperature: 125°C; Capacitance: 150uF; Tolerance: 10%; Packaging: Tape and Reel; Voltage Rating: 10V; Termination: SMD/SMT; Voltage Rating (DC): 10V; Series: T495; Construction: Flat; Package Quantity: 500; Voltage: 10V; Features: General Purpose; Failure Rate: 0.001%; Length: 7.3mm; Width: 4.3mm; Height: 3.1mm; Height - Seated (Max): 0.122inch; Depth: 4.3mm; Radiation Hardening: No; RoHS Compliant: Yes; Reach SVHC Compliant: Unknown; ComponentLink1URL: https://datasheet.ciiva.com/5933/kem-t2009-t495-5933802.pdf?src-supplier=Farnell; ComponentLink1Description: https://datasheet.ciiva.com/5933/kem-t2009-t495-5933802.pdf?src-supplier=Farnell; ComponentLink2URL: https://datasheet.ciiva.com/7668/kem-t2009-t495-7668186.pdf?src-supplier=Element14; ComponentLink2Description: https://datasheet.ciiva.com/7668/kem-t2009-t495-7668186.pdf?src-supplier=Element14; Supplier Part Number 1: 399-8506-1-ND
footprint CAP_TAMTALIUM_T495D
pins: 1 +, 2 -
